# Altium footprint library PcbLib1.PcbLib: 157 footprints (part 8 of 10)
Each footprint in its own frame and in the unit in brackets; x right, y up, seen from the top. Pads: shape width x height; smd on the part's side, far side on the other; paste and mask are expansions set on the pad; w line width, h text height; cw(c..) or ccw(c..) is an arc to the next point about the centre after c.
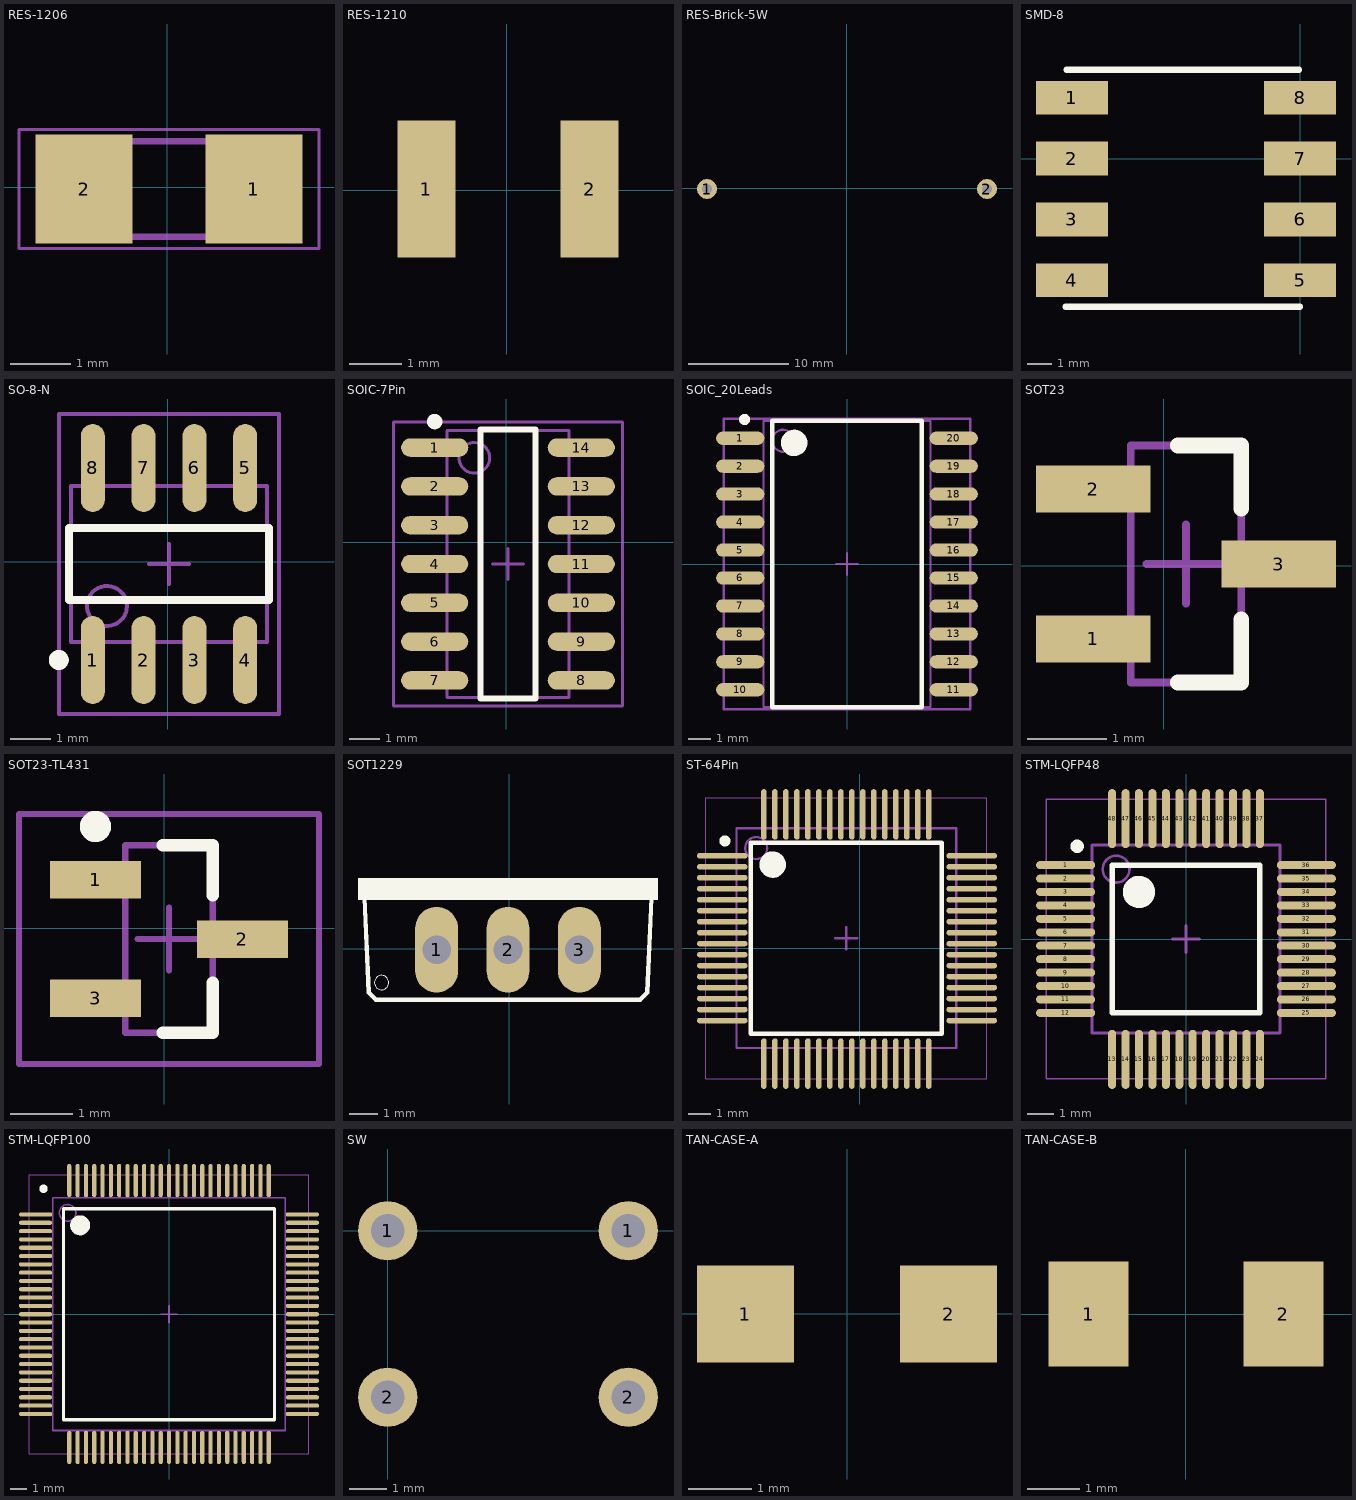
[diagram p7: the footprints below, top view; thin cyan lines are the x and y axes]

## RES-1206 [mm]
pads (2):
  rect 1.6x1.8 smd paste-25.4 mask-25.4: 1(1.425,-0.025) 2(-1.375,-0.025)
Top Paste:
  region: 2.225,0.875 0.625,0.875 0.625,-0.925 2.225,-0.925
  region: -0.575,0.875 -2.175,0.875 -2.175,-0.925 -0.575,-0.925
Top Solder:
  region: 2.325,0.975 0.525,0.975 0.525,-1.025 2.325,-1.025
  region: -0.475,0.975 -2.275,0.975 -2.275,-1.025 -0.475,-1.025
Mechanical 1:
  lines w0.051: -2.448,-1.008 2.498,-1.008 2.498,0.958 -2.448,0.958 -2.448,-1.008
  lines w0.102: -0.94,-0.812 0.99,-0.812 ; -0.94,0.762 0.99,0.762
3D body "User Library-RES1206-2.STEP": height 0.55, standoff 0, extent -1.505,-0.775 1.505,0.775

## RES-1210 [mm]
pads (2):
  rect 1.1x2.6 smd: 1(-1.527,0.026) 2(1.573,0.026)
3D body "User Library-R_1210.STEP": height 0.6, standoff 0, extent -1.6,-1.225 1.6,1.275

## RES-Brick-5W [mm]
pads (2):
  round 2 hole 1: 1(-13.97,-0.051) 2(13.995,-0.051)
3D body "User Library-Cement Fixed Resistors 5W 330R PCB Horizontal.STEP": height 9, standoff -3.6, extent -14.294,-5.051 14.396,4.949

## SMD-8 [mm]
pads (8):
  rect 3x1.4 smd: 1(-9.5,2.54) 2(-9.5,0) 3(-9.5,-2.54) 4(-9.5,-5.08) 5(0,-5.08) 6(0,-2.54) 7(0,0) 8(0,2.54)
Top Overlay:
  lines w0.254: -9.775,-6.175 0,-6.175 ; -9.725,3.7 -0.05,3.7
3D body "User Library-SMD-8C.STEP": height 4, standoff 0, extent -9.775,-6.175 0.025,3.675

## SO-8-N [mm]
pads (8):
  oval 0.6x2.2 smd: 1(-1.877,-2.451) 2(-0.607,-2.451) 3(0.663,-2.451) 4(1.933,-2.451) 5(1.933,2.349) 6(0.663,2.349) 7(-0.607,2.349) 8(-1.877,2.349)
Top Overlay:
  circle w0.25: c-2.727,-2.451 r0.125
  lines w0.2: -2.472,-0.951 -2.472,0.849 2.528,0.849 2.528,-0.951 -2.472,-0.951
Mechanical 13:
  circle w0.1: c-1.522,-1.101 r0.5
  lines w0.1: -2.422,-2.001 -2.422,1.899 2.478,1.899 2.478,-2.001 -2.422,-2.001
Mechanical 15:
  lines w0.1: -0.472,-0.051 0.528,-0.051 ; 0.028,-0.551 0.028,0.449 ; -2.722,-3.801 -2.722,3.699 2.778,3.699 2.778,-3.801 -2.722,-3.801
3D body "User Library-so8-3.STEP": height 1.7, standoff 0, extent -2.422,-3.026 2.478,2.974

## SOIC-7Pin [mm]
pads (14):
  oval 2.2x0.6 smd: 1(-2.35,3.096) 2(-2.35,1.826) 3(-2.35,0.556) 4(-2.35,-0.714) 5(-2.35,-1.984) 6(-2.35,-3.254) 7(-2.35,-4.524) 8(2.45,-4.524) 9(2.45,-3.254) 10(2.45,-1.984) 11(2.45,-0.714) 12(2.45,0.556) 13(2.45,1.826) 14(2.45,3.096)
Top Overlay:
  circle w0.25: c-2.35,3.946 r0.125
  lines w0.2: -0.85,-5.114 0.95,-5.114 0.95,3.686 -0.85,3.686 -0.85,-5.114
Mechanical 13:
  circle w0.1: c-1.05,2.761 r0.5
  lines w0.1: -1.95,-5.089 2.05,-5.089 2.05,3.661 -1.95,3.661 -1.95,-5.089
Mechanical 15:
  lines w0.1: -0.45,-0.714 0.55,-0.714 ; 0.05,-1.214 0.05,-0.214 ; -3.7,-5.364 3.8,-5.364 3.8,3.936 -3.7,3.936 -3.7,-5.364
3D body: height 1.75, standoff 0, extent -1.95,-5.089 2.05,3.661

## SOIC_20Leads [mm] "SOIC, 20-Leads, Body 12.8x7.5mm, Pitch 1.27mm, IPC High Density"
height 2.65
pads (20):
  oval 2.2x0.6 smd: 1(-4.85,5.715) 2(-4.85,4.445) 3(-4.85,3.175) 4(-4.85,1.905) 5(-4.85,0.635) 6(-4.85,-0.635) 7(-4.85,-1.905) 8(-4.85,-3.175) 9(-4.85,-4.445) 10(-4.85,-5.715) 11(4.85,-5.715) 12(4.85,-4.445) 13(4.85,-3.175) 14(4.85,-1.905) 15(4.85,-0.635) 16(4.85,0.635) 17(4.85,1.905) 18(4.85,3.175) 19(4.85,4.445) 20(4.85,5.715)
Top Overlay:
  circle w0.25: c-4.65,6.565 r0.125
  circle w0.6: c-2.4,5.5 r0.3
  lines w0.2: -3.4,-6.5 -3.4,6.5 3.4,6.5 3.4,-6.5 -3.4,-6.5
Mechanical 13:
  circle w0.1: c-2.9,5.6 r0.5
  lines w0.1: -3.8,-6.5 -3.8,6.5 3.8,6.5 3.8,-6.5 -3.8,-6.5
Mechanical 15:
  lines w0.1: -0.5,0 0.5,0 ; 0,-0.5 0,0.5 ; -5.6,-6.6 -5.6,6.6 5.6,6.6 5.6,-6.6 -5.6,-6.6
3D body "User Library-SO-20 (Wide).STEP": height 2.7, standoff 0, extent -5.15,-6.4 5.15,6.4

## SOT23 [mm]
pads (3):
  rect 1.45x0.6 smd: 1(-0.896,-0.925) 2(-0.896,0.975) 3(1.454,0.025)
Top Overlay:
  lines w0.2: 0.179,-1.475 0.979,-1.475 0.979,-0.675 ; 0.179,1.525 0.979,1.525 0.979,0.725
Mechanical 13:
  lines w0.1: -0.421,-1.475 0.979,-1.475 0.979,1.525 -0.421,1.525 -0.421,-1.475
Mechanical 15:
  lines w0.1: -0.221,0.025 0.779,0.025 ; 0.279,-0.475 0.279,0.525
3D body "ALSRobot-SOT23.STEP": height 1.08, standoff 0, extent -1.07,-1.475 1.57,1.525

## SOT23-TL431 [mm]
pads (3):
  rect 1.45x0.6 smd: 1(-1.096,0.775) 2(1.254,-0.175) 3(-1.096,-1.125)
Top Overlay:
  circle w0.25: c-1.096,1.625 r0.125
  lines w0.2: -0.021,-1.675 0.779,-1.675 0.779,-0.875 ; -0.021,1.325 0.779,1.325 0.779,0.525
Mechanical 13:
  lines w0.1: -0.621,-1.675 -0.621,1.325 0.779,1.325 0.779,-1.675 -0.621,-1.675
Mechanical 15:
  lines w0.1: -0.421,-0.175 0.579,-0.175 ; 0.079,-0.675 0.079,0.325 ; -2.321,-2.175 -2.321,1.825 2.479,1.825 2.479,-2.175 -2.321,-2.175
3D body: height 1.12, standoff 0, extent -0.621,-1.675 0.779,1.325

## SOT1229 [mil]
pads (3):
  oval 60x120 hole 40: 1(-101.81,-1.06) 2(-1.81,-1.06) 3(98.19,-1.06)
Top Overlay:
  circle w0: c-178.81,-47.06 r10
  region: -211.81,98.94 208.19,98.94 208.19,68.94 -211.81,68.94
  lines w6: -202.59,71.9 -196.81,-61.06 -186.81,-71.06 183.19,-71.06 193.19,-61.06 198.96,71.76

## ST-64Pin [mm]
pads (64):
  oval 2.3x0.25 smd: 1(-6.25,4.216) 2(-6.25,3.717) 3(-6.25,3.216) 4(-6.25,2.716) 5(-6.25,2.217) 6(-6.25,1.716) 7(-6.25,1.216) 8(-6.25,0.716) 9(-6.25,0.216) 10(-6.25,-0.283) 11(-6.25,-0.784) 12(-6.25,-1.284) 13(-6.25,-1.784) 14(-6.25,-2.284) 15(-6.25,-2.783) 16(-6.25,-3.284) 33(5.1,-3.284) 34(5.1,-2.783) 35(5.1,-2.284) 36(5.1,-1.784) 37(5.1,-1.284) 38(5.1,-0.784) 39(5.1,-0.283) 40(5.1,0.216) 41(5.1,0.716) 42(5.1,1.216) 43(5.1,1.716) 44(5.1,2.217) 45(5.1,2.716) 46(5.1,3.216) 47(5.1,3.717) 48(5.1,4.216)
  oval 0.25x2.3 smd: 17(-4.356,-5.24) 18(-3.856,-5.24) 19(-3.356,-5.24) 20(-2.856,-5.24) 21(-2.356,-5.24) 22(-1.856,-5.24) 23(-1.356,-5.24) 24(-0.856,-5.24) 25(-0.356,-5.24) 26(0.144,-5.24) 27(0.644,-5.24) 28(1.144,-5.24) 29(1.644,-5.24) 30(2.144,-5.24) 31(2.644,-5.24) 32(3.144,-5.24) 49(3.144,6.1) 50(2.644,6.1) 51(2.144,6.1) 52(1.644,6.1) 53(1.144,6.1) 54(0.644,6.1) 55(0.144,6.1) 56(-0.356,6.1) 57(-0.856,6.1) 58(-1.356,6.1) 59(-1.856,6.1) 60(-2.356,6.1) 61(-2.856,6.1) 62(-3.356,6.1) 63(-3.856,6.1) 64(-4.356,6.1)
Top Overlay:
  circle w0.25: c-6.131,4.891 r0.125
  circle w0.6: c-3.956,3.816 r0.3
  lines w0.2: -4.956,-3.883 -4.956,4.817 3.744,4.817 3.744,-3.883 -4.956,-3.883
Mechanical 13:
  circle w0.1: c-4.706,4.566 r0.5
  lines w0.1: -5.606,-4.534 -5.606,5.466 4.394,5.466 4.394,-4.534 -5.606,-4.534
Mechanical 15:
  lines w0.05: -7.006,-5.934 -7.006,6.866 5.794,6.866 5.794,-5.934 -7.006,-5.934
  lines w0.1: -1.106,0.466 -0.106,0.466 ; -0.606,-0.034 -0.606,0.967
3D body: height 1.6, standoff 1.6, extent -4.6,-3.3 2.6,-1.084
3D body "User Library-STM32F107 -LQFP64 10mm x 10mm.STEP": height 1.6, standoff 0.01, extent -6.599,-5.499 5.399,6.499

## STM-LQFP48 [mm] "QFP, 48-Leads, Body 7x7mm, Pitch 0.5mm, IPC Medium Density"
height 1.6
pads (48):
  oval 2.2x0.3 smd: 1(-4.482,2.75) 2(-4.482,2.25) 3(-4.482,1.75) 4(-4.482,1.25) 5(-4.482,0.75) 6(-4.482,0.25) 7(-4.482,-0.25) 8(-4.482,-0.75) 9(-4.482,-1.25) 10(-4.482,-1.75) 11(-4.482,-2.25) 12(-4.482,-2.75) 25(4.482,-2.75) 26(4.482,-2.25) 27(4.482,-1.75) 28(4.482,-1.25) 29(4.482,-0.75) 30(4.482,-0.25) 31(4.482,0.25) 32(4.482,0.75) 33(4.482,1.25) 34(4.482,1.75) 35(4.482,2.25) 36(4.482,2.75)
  oval 0.3x2.2 smd: 13(-2.75,-4.482) 14(-2.25,-4.482) 15(-1.75,-4.482) 16(-1.25,-4.482) 17(-0.75,-4.482) 18(-0.25,-4.482) 19(0.25,-4.482) 20(0.75,-4.482) 21(1.25,-4.482) 22(1.75,-4.482) 23(2.25,-4.482) 24(2.75,-4.482) 37(2.75,4.482) 38(2.25,4.482) 39(1.75,4.482) 40(1.25,4.482) 41(0.75,4.482) 42(0.25,4.482) 43(-0.25,4.482) 44(-0.75,4.482) 45(-1.25,4.482) 46(-1.75,4.482) 47(-2.25,4.482) 48(-2.75,4.482)
Top Overlay:
  circle w0.25: c-4.05,3.45 r0.125
  circle w0.6: c-1.75,1.75 r0.3
  lines w0.2: -2.75,-2.75 -2.75,2.75 2.75,2.75 2.75,-2.75 -2.75,-2.75
Mechanical 13:
  circle w0.1: c-2.6,2.6 r0.5
  lines w0.1: -3.5,-3.5 -3.5,3.5 3.5,3.5 3.5,-3.5 -3.5,-3.5
Mechanical 15:
  lines w0.05: -5.2,-5.2 -5.2,5.2 5.2,5.2 5.2,-5.2 -5.2,-5.2
  lines w0.1: -0.5,0 0.5,0 ; 0,-0.5 0,0.5
3D body "User Library-LQFP48-2.STEP": height 1.62, standoff -0.01, extent -4.572,-4.572 4.572,4.572

## STM-LQFP100 [mm] "Thin QFP, 100-Leads, Body 14x14mm, Pitch 0.5mm, IPC High Density"
height 1.6
pads (100):
  oval 2x0.25 smd: 1(-8.026,6) 2(-8.026,5.5) 3(-8.026,5) 4(-8.026,4.5) 5(-8.026,4) 6(-8.026,3.5) 7(-8.026,3) 8(-8.026,2.5) 9(-8.026,2) 10(-8.026,1.5) 11(-8.026,1) 12(-8.026,0.5) 13(-8.026,0) 14(-8.026,-0.5) 15(-8.026,-1) 16(-8.026,-1.5) 17(-8.026,-2) 18(-8.026,-2.5) 19(-8.026,-3) 20(-8.026,-3.5) 21(-8.026,-4) 22(-8.026,-4.5) 23(-8.026,-5) 24(-8.026,-5.5) 25(-8.026,-6) 51(8.024,-6) 52(8.024,-5.5) 53(8.024,-5) 54(8.024,-4.5) 55(8.024,-4) 56(8.024,-3.5) 57(8.024,-3) 58(8.024,-2.5) 59(8.024,-2) 60(8.024,-1.5) 61(8.024,-1) 62(8.024,-0.5) 63(8.024,0) 64(8.024,0.5) 65(8.024,1) 66(8.024,1.5) 67(8.024,2) 68(8.024,2.5) 69(8.024,3) 70(8.024,3.5) 71(8.024,4) 72(8.024,4.5) 73(8.024,5) 74(8.024,5.5) 75(8.024,6)
  oval 0.25x2 smd: 26(-6,-8.012) 27(-5.5,-8.012) 28(-5,-8.012) 29(-4.5,-8.012) 30(-4,-8.012) 31(-3.5,-8.012) 32(-3,-8.012) 33(-2.5,-8.012) 34(-2,-8.012) 35(-1.5,-8.012) 36(-1,-8.012) 37(-0.5,-8.012) 38(0,-8.012) 39(0.5,-8.012) 40(1,-8.012) 41(1.5,-8.012) 42(2,-8.012) 43(2.5,-8.012) 44(3,-8.012) 45(3.5,-8.012) 46(4,-8.012) 47(4.5,-8.012) 48(5,-8.012) 49(5.5,-8.012) 50(6,-8.012) 76(6,8.038) 77(5.5,8.038) 78(5,8.038) 79(4.5,8.038) 80(4,8.038) 81(3.5,8.038) 82(3,8.038) 83(2.5,8.038) 84(2,8.038) 85(1.5,8.038) 86(1,8.038) 87(0.5,8.038) 88(0,8.038) 89(-0.5,8.038) 90(-1,8.038) 91(-1.5,8.038) 92(-2,8.038) 93(-2.5,8.038) 94(-3,8.038) 95(-3.5,8.038) 96(-4,8.038) 97(-4.5,8.038) 98(-5,8.038) 99(-5.5,8.038) 100(-6,8.038)
Top Overlay:
  circle w0.25: c-7.55,7.55 r0.125
  circle w0.6: c-5.35,5.35 r0.3
  lines w0.2: -6.35,-6.35 -6.35,6.35 6.35,6.35 6.35,-6.35 -6.35,-6.35
Mechanical 13:
  circle w0.1: c-6.1,6.1 r0.5
  lines w0.1: -7,-7 -7,7 7,7 7,-7 -7,-7
Mechanical 15:
  lines w0.05: -8.4,-8.4 -8.4,8.4 8.4,8.4 8.4,-8.4 -8.4,-8.4
  lines w0.1: -0.5,0 0.5,0 ; 0,-0.5 0,0.5
3D body "User Library-lqfp-100-pzp.STEP": height 1.05, standoff -0.06, extent -8.006,-8.006 8.006,8.006

## SW [mm]
pads (4):
  round 1.6 hole 0.9: 1(0,0) 1(6.5,0) 2(0,-4.5) 2(6.5,-4.5)
3D body "User Library-TPxxxx (Switch).STEP": height 4.9, standoff -3.59, extent -0.724,-5.2 7.25,0.8

## TAN-CASE-A [mil]
pads (2):
  rect 60x60 smd: 1(-63,0) 2(62.99,0)
3D body "User Library-CaseA_3216-18.STEP": height 62.99, standoff 0, extent -63,-31.5 62.99,31.49

## TAN-CASE-B [mm]
pads (2):
  rect 1.524x2 smd: 1(-1.85,0) 2(1.85,0)
3D body "User Library-AVX_BCASE.STEP": height 2.03, standoff 0, extent -1.85,-1.465 1.85,1.465